# Altium footprint library my Library.PcbLib: 1247 footprints (part 7 of 78)
Each footprint in its own frame and in the unit in brackets; x right, y up, seen from the top. Pads: shape width x height; smd on the part's side, far side on the other; paste and mask are expansions set on the pad; w line width, h text height; cw(c..) or ccw(c..) is an arc to the next point about the centre after c.
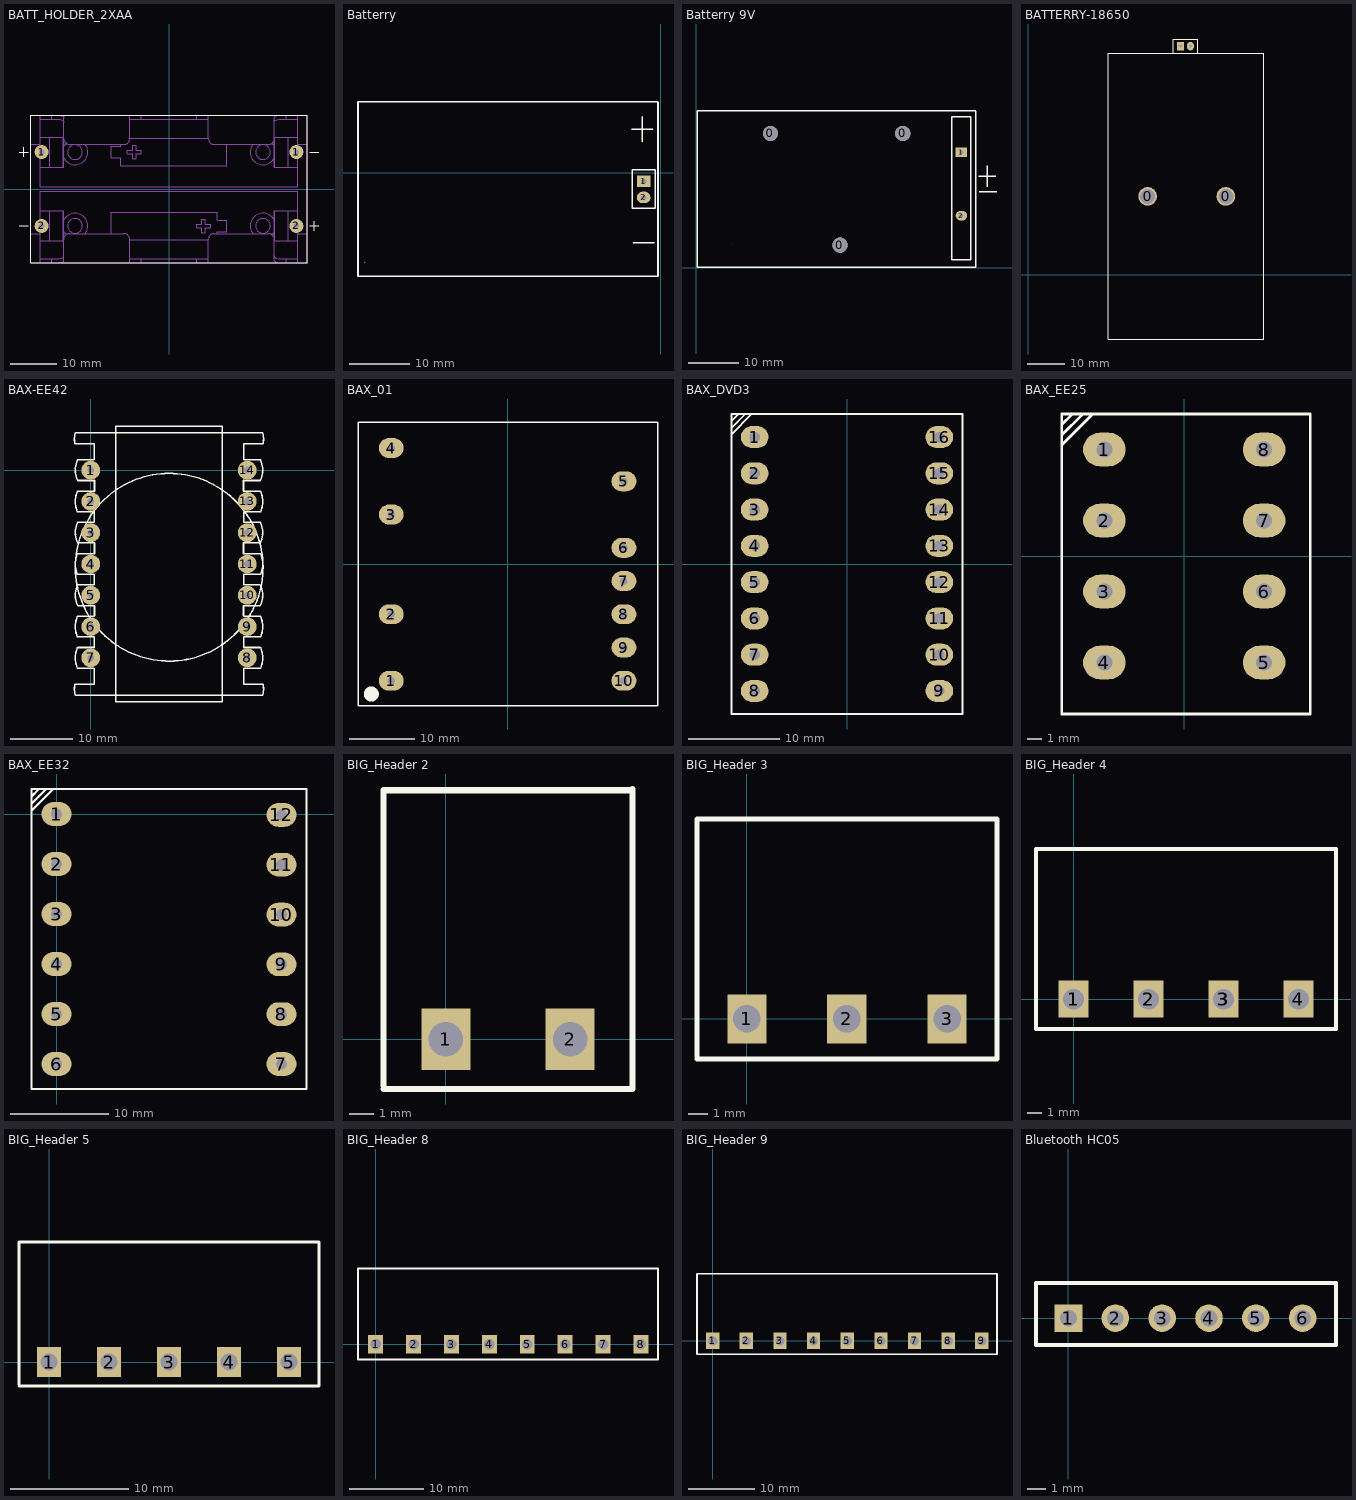
[diagram p6: the footprints below, top view; thin cyan lines are the x and y axes]

## BATT_HOLDER_2XAA [mil] "2-cell AA battery holder"
height 660
pads (4):
  round 120 hole 48: 1(-1086.61,314.96) 1(1086.61,314.96) 2(-1086.61,-314.96) 2(1086.61,-314.96)
Top Overlay:
  lines w5: -1279.53,-314.96 -1200.79,-314.96 ; -1279.53,314.96 -1200.79,314.96 ; -1240.16,275.59 -1240.16,354.33 ; 1200.79,-314.96 1279.53,-314.96 ; 1200.79,314.96 1279.53,314.96 ; 1240.16,-354.33 1240.16,-275.59
  lines w7.87: -1181.1,-629.92 1181.1,-629.92 1181.1,629.92 -1181.1,629.92 -1181.1,-629.92
Mechanical 13:
  drawing of 198 lines, arcs and shapes, not listed
3D body "2xAA Battery Holder.STEP": height 657.48, standoff -118.11, extent -1181.1,-629.91 1181.1,629.93
3D body "User Library-Battery-AAA.STEP": height 595.47, standoff 191.93, extent -958.03,55 788.03,458.55
3D body "User Library-Battery-AAA.STEP": height 595.47, standoff 191.93, extent -918.03,-470 828.03,-66.45

## Batterry [mil]
pads (2):
  rect 90x75 hole 34: 1(-112.5,-54.6)
  oval 90x75 hole 34: 2(-112.5,-159.6)
Top Overlay:
  lines w10: -188.8,284 -54.5,284 ; -182.1,-455.9 -43.1,-455.9 ; -120.9,202.1 -120.9,365.8 ; -20,463.4 -1974.6,463.4 -1974.6,-672.4 -19.27,-672.4 -19.27,459.86 ; -187.5,-229.6 -187.5,20.4 -37.5,20.4 -37.5,-229.6 -187.5,-229.6
Mechanical 1:
  lines w10: -1929.25,-583.45 -1929.2,-583.41
3D body "User Library-Aluminum 9 Volt Battery Holder.STEP": height 718.5, standoff 0, extent -1960.3,-666.19 -27.8,458.8

## Batterry 9V [mil]
pads (5):
  round 120 hole 120: 0(581.4,1052.4) 0(1126.9,175.9) 0(1620.4,1052.5)
  rect 90x75 hole 34: 1(2080.5,905.75)
  oval 90x75 hole 34: 2(2080.5,407.05)
Top Overlay:
  lines w10: 2193,1230.1 4.6,1230.1 4.6,3.1 2193.73,3.1 2193.73,1226.56 ; 2216.7,717.5 2351,717.5 ; 2221,595 2360,595 ; 2284.6,635.6 2284.6,799.3 ; 2005.5,60 2155.5,60 2155.5,1185 2005.5,1185 2005.5,60
Mechanical 1:
  lines w10: 283.75,183.25 283.8,183.29
3D body "User Library-PP3 9V battery holder.STEP": height 855.91, standoff 44.88, extent 27.27,19.55 2172.93,1210.5
3D body "User Library-9V Duracell Battery-1.STEP": height 894.49, standoff 205.51, extent 140.78,88.65 2050.23,1131.96

## BATTERRY-18650 [mil]
pads (4):
  round 196.85 hole 157.48: 0(1260,825) 0(2085,825)
  rect 75x90 hole 34: 1(1606.1,2410.5)
  oval 75x90 hole 34: 2(1711.1,2410.5)
Top Overlay:
  lines w10: 845,-680 845,2335 2485,2335 2485,-680 845,-680 ; 1531.1,2335.5 1531.1,2485.5 1781.1,2485.5 1781.1,2335.5 1531.1,2335.5
3D body "User Library-18650 battery.STEP": height 959.53, standoff 242.99, extent 905,-497.48 1621.53,2067.48
3D body "User Library-18650 holder x2.STEP": height 826.77, standoff 0, extent 860.82,-671.06 2475,2321.06
3D body "User Library-18650 battery - Copy.STEP": height 959.53, standoff 242.99, extent 1698.47,-492.48 2415,2072.48

## BAX-EE42 [mm]
pads (14):
  round 3 hole 1.1: 1(0,0) 2(0,-5) 3(0,-10) 4(0,-15) 5(0,-20) 6(0,-25) 7(0,-30) 8(25,-30) 9(25,-25) 10(25,-20) 11(25,-15) 12(25,-10) 13(25,-5) 14(25,0)
Top Overlay:
  lines w0.254: -2.54,-34.199 ccw(c1.383,-34.971) -2.495,-35.943 ; -2.54,4.201 cw(c1.383,4.974) -2.495,5.945 ; -2.515,-34.188 0.559,-34.188 0.559,-31.648 -2.083,-31.648 ; -2.515,4.191 0.559,4.191 0.559,1.651 -2.083,1.651 ; -2.5,-36 27.5,-36 ; -2.5,6 27.5,6 ; -2.464,-14.986 ccw(c12.522,-15.519) -2.458,-14.838 ; -2.147,-28.374 ccw(c1.506,-30.001) -2.136,-31.652 ; -2.147,-23.371 ccw(c1.506,-24.997) -2.136,-26.648 ; -2.147,-13.363 ccw(c1.506,-14.989) -2.136,-16.64 ; -2.147,-3.381 ccw(c1.506,-5.007) -2.136,-6.658 ; -2.121,-18.367 ccw(c1.531,-19.993) -2.11,-21.644 ; -2.121,-8.359 ccw(c1.531,-9.985) -2.11,-11.636 ; -2.121,1.623 ccw(c1.531,-0.003) -2.11,-1.654 ; -2.108,-28.346 0.533,-28.346 ; -2.108,-23.343 0.533,-23.343 ; -2.108,-13.335 0.533,-13.335 ; -2.108,-3.353 0.533,-3.353 ; -2.083,-26.645 0.559,-26.645 ; -2.083,-18.339 0.559,-18.339 ; -2.083,-16.637 0.559,-16.637 0.559,-18.288 ; -2.083,-8.331 0.559,-8.331 ; -2.083,-6.655 0.559,-6.655 0.559,-8.306 ; -2.057,-21.641 0.584,-21.641 0.584,-23.292 ; -2.057,-11.633 0.584,-11.633 ; -2.057,-1.651 0.584,-1.651 ; 0.559,-28.321 0.559,-26.67 ; 0.584,-13.335 0.584,-11.684 ; 0.584,-3.353 0.584,-1.702 ; 4.013,-37.008 4.013,7.01 20.98,7.01 20.98,-37.008 4.039,-37.008 ; 24.409,-23.292 24.409,-21.641 27.051,-21.641 ; 24.409,-13.335 24.409,-11.684 ; 24.409,-11.633 27.051,-11.633 ; 24.409,-3.353 24.409,-1.702 ; 24.409,-1.651 27.051,-1.651 ; 24.435,-28.321 24.435,-26.67 ; 24.435,-26.645 27.076,-26.645 ; 24.435,-18.339 27.076,-18.339 ; 24.435,-18.288 24.435,-16.637 27.076,-16.637 ; 24.435,-8.331 27.076,-8.331 ; 24.435,-8.306 24.435,-6.655 27.076,-6.655 ; 24.46,-28.346 27.102,-28.346 ; 24.46,-23.343 27.102,-23.343 ; 24.46,-13.335 27.102,-13.335 ; 24.46,-3.353 27.102,-3.353 ; 27.076,-31.648 24.435,-31.648 24.435,-34.188 27.508,-34.188 ; 27.076,1.651 24.435,1.651 24.435,4.191 27.508,4.191 ; 27.104,-21.644 ccw(c23.462,-19.993) 27.115,-18.367 ; 27.104,-11.636 ccw(c23.462,-9.985) 27.115,-8.359 ; 27.104,-1.654 ccw(c23.462,-0.003) 27.115,1.623 ; 27.129,-31.652 ccw(c23.488,-30.001) 27.14,-28.374 ; 27.129,-26.648 ccw(c23.488,-24.997) 27.14,-23.371 ; 27.129,-16.64 ccw(c23.488,-14.989) 27.14,-13.363 ; 27.129,-6.658 ccw(c23.488,-5.007) 27.14,-3.381 ; 27.489,-35.943 ccw(c23.61,-34.971) 27.533,-34.199 ; 27.489,5.945 cw(c23.61,4.974) 27.533,4.201

## BAX_01 [mil] "Bien ap xung cho nguon T9AT"
pads (10):
  oval 150x120 hole 45: 1(-700,-700) 2(-700,-300) 3(-700,300) 4(-700,700) 5(700,500) 6(700,100) 7(700,-100) 8(700,-300) 9(700,-500) 10(700,-700)
Top Overlay:
  circle w50: c-820,-780 r20
  lines w8: -900,-850 905,-850 905,855 -900,855 -900,-850

## BAX_DVD3 [mil] "Bien ap xung DVD3"
pads (16):
  oval 120x95 hole 45: 1(-400,550) 2(-400,392.86) 3(-400,235.71) 4(-400,78.57) 5(-400,-78.57) 6(-400,-235.71) 7(-400,-392.86) 8(-400,-550) 9(400,-550) 10(400,-392.86) 11(400,-235.71) 12(400,-78.57) 13(400,78.57) 14(400,235.71) 15(400,392.86) 16(400,550)
Top Overlay:
  lines w8: -500,563 -414,649 ; -500,589 -500,591 -442,649 ; -500,618 -500,620 -471,649 ; -500,-650 -500,650 490,650 500,650 500,-650 -500,-650

## BAX_EE25 [mil] "EE25"
pads (8):
  oval 120x95 hole 45: 1(-225,300) 2(-225,100) 3(-225,-100) 4(-225,-300) 5(225,-300) 6(225,-100) 7(225,100) 8(225,300)
Top Overlay:
  lines w8: -345,313 -259,399 ; -345,339 -345,341 -287,399 ; -345,368 -345,370 -316,399 ; -345,-445 355,-445 355,400 -345,400 -345,-445

## BAX_EE32 [mil] "EE32"
pads (12):
  oval 120x95 hole 45: 1(0,0) 2(0,-200) 3(0,-400) 4(0,-600) 5(0,-800) 6(0,-1000) 7(900,-1000) 8(900,-800.71) 9(900,-601.43) 10(900,-402.14) 11(900,-202.86) 12(900,-3.57)
Top Overlay:
  lines w8: -100,13 -14,99 ; -100,39 -100,41 -42,99 ; -100,68 -100,70 -71,99 ; -100,-1100 1000,-1100 1000,100 -100,100 -100,-1100

## BIG_Header 2 [mm]
pads (2):
  rect 2x2.5 hole 1.4: 1(0,0) 2(5.08,0)
Top Overlay:
  lines w0.254: -2.54,-2.032 7.62,-2.032 7.62,10.211 ; -2.54,-1.905 -2.54,10.173 ; -2.54,10.16 7.62,10.16
3D body "User Library-BigHeader 5EHDR_1P.step": height 3.15, standoff -9.32, extent -2.5,-1.75 2.5,10.25
3D body "User Library-BigHeader 5EHDR_1P.step": height 3.15, standoff -9.32, extent 2.58,-1.75 7.58,10.25

## BIG_Header 3 [mm]
pads (3):
  rect 2x2.5 hole 1.4: 1(0,0) 2(5.08,0) 3(10.173,0)
Top Overlay:
  lines w0.254: -2.54,-2.032 12.713,-2.032 12.713,10.16 -2.54,10.16 -2.54,-1.905
3D body "User Library-BigHeader 5EHDR_1P.step": height 3.15, standoff -9.32, extent 7.673,-1.75 12.673,10.25
3D body "User Library-BigHeader 5EHDR_1P.step": height 3.15, standoff -9.32, extent 2.593,-1.75 7.593,10.25
3D body "User Library-BigHeader 5EHDR_1P.step": height 3.15, standoff -9.32, extent -2.5,-1.75 2.5,10.25

## BIG_Header 4 [mm]
pads (7):
  rect 2x2.5 hole 1.4: 1(0,0) 1(0,0) 2(5.08,0) 2(5.08,0) 3(10.16,0) 3(10.173,0) 4(15.24,0)
Top Overlay:
  lines w0.254: 12.713,-2.032 -2.54,-2.032 7.62,-2.032 17.78,-2.032 17.78,10.173 -2.527,10.173 -2.54,10.173 -2.54,-1.905 -2.54,10.16 ; 12.713,10.16 -2.54,10.16 ; 17.78,10.16 -2.54,10.16
3D body "User Library-BigHeader 5EHDR_1P.step": height 3.15, standoff -9.32, extent 12.74,-1.75 17.74,10.25
3D body "User Library-BigHeader 5EHDR_1P.step": height 3.15, standoff -9.32, extent 7.66,-1.75 12.66,10.25
3D body "User Library-BigHeader 5EHDR_1P.step": height 3.15, standoff -9.32, extent 2.58,-1.75 7.58,10.25
3D body "User Library-BigHeader 5EHDR_1P.step": height 3.15, standoff -9.32, extent -2.5,-1.75 2.5,10.25

## BIG_Header 5 [mm]
pads (5):
  rect 2x2.5 hole 1.4: 1(0,0) 2(5.08,0) 3(10.16,0) 4(15.24,0) 5(20.32,0)
Top Overlay:
  lines w0.254: -2.54,-2.032 7.62,-2.032 22.86,-2.032 22.86,10.16 ; -2.54,-1.905 -2.54,10.16 ; -2.54,10.16 6.248,10.16 22.86,10.16 ; -2.54,10.16 22.86,10.16
3D body "User Library-BigHeader 5EHDR_1P.step": height 3.15, standoff -9.32, extent 17.82,-1.75 22.82,10.25
3D body "User Library-BigHeader 5EHDR_1P.step": height 3.15, standoff -9.32, extent 12.74,-1.75 17.74,10.25
3D body "User Library-BigHeader 5EHDR_1P.step": height 3.15, standoff -9.32, extent 7.66,-1.75 12.66,10.25
3D body "User Library-BigHeader 5EHDR_1P.step": height 3.15, standoff -9.32, extent 2.58,-1.75 7.58,10.25
3D body "User Library-BigHeader 5EHDR_1P.step": height 3.15, standoff -9.32, extent -2.5,-1.75 2.5,10.25

## BIG_Header 8 [mm]
pads (8):
  rect 2x2.5 hole 1.4: 1(0,0) 2(5.08,0) 3(10.16,0) 4(15.24,0) 5(20.32,0) 6(25.4,0) 7(30.48,0) 8(35.56,0)
Top Overlay:
  lines w0.254: 13.843,10.16 37.846,10.16 37.846,-2.032 27.94,-2.032 17.78,-2.032 7.62,-2.032 -2.362,-2.032 -2.362,10.16 17.78,10.16
3D body "User Library-BigHeader 5EHDR_1P.step": height 3.15, standoff -9.32, extent -2.5,-1.75 2.5,10.25
3D body "User Library-BigHeader 5EHDR_1P.step": height 3.15, standoff -9.32, extent 2.58,-1.75 7.58,10.25
3D body "User Library-BigHeader 5EHDR_1P.step": height 3.15, standoff -9.32, extent 7.66,-1.75 12.66,10.25
3D body "User Library-BigHeader 5EHDR_1P.step": height 3.15, standoff -9.32, extent 12.74,-1.75 17.74,10.25
3D body "User Library-BigHeader 5EHDR_1P.step": height 3.15, standoff -9.32, extent 17.82,-1.75 22.82,10.25
3D body "User Library-BigHeader 5EHDR_1P.step": height 3.15, standoff -9.32, extent 22.9,-1.75 27.9,10.25
3D body "User Library-BigHeader 5EHDR_1P.step": height 3.15, standoff -9.32, extent 27.98,-1.75 32.98,10.25
3D body "User Library-BigHeader 5EHDR_1P.step": height 3.15, standoff -9.32, extent 33.06,-1.75 38.06,10.25

## BIG_Header 9 [mm]
pads (9):
  rect 2x2.5 hole 1.4: 1(0,0) 2(5.08,0) 3(10.16,0) 4(15.24,0) 5(20.32,0) 6(25.4,0) 7(30.48,0) 8(35.56,0) 9(40.64,0)
Top Overlay:
  lines w0.254: 13.843,10.16 42.926,10.16 42.926,-2.032 27.94,-2.032 17.78,-2.032 7.62,-2.032 -2.362,-2.032 -2.362,10.16 17.78,10.16
3D body "User Library-BigHeader 5EHDR_1P.step": height 3.15, standoff -9.32, extent -2.5,-1.75 2.5,10.25
3D body "User Library-BigHeader 5EHDR_1P.step": height 3.15, standoff -9.32, extent 2.58,-1.75 7.58,10.25
3D body "User Library-BigHeader 5EHDR_1P.step": height 3.15, standoff -9.32, extent 7.66,-1.75 12.66,10.25
3D body "User Library-BigHeader 5EHDR_1P.step": height 3.15, standoff -9.32, extent 12.74,-1.75 17.74,10.25
3D body "User Library-BigHeader 5EHDR_1P.step": height 3.15, standoff -9.32, extent 17.82,-1.75 22.82,10.25
3D body "User Library-BigHeader 5EHDR_1P.step": height 3.15, standoff -9.32, extent 22.9,-1.75 27.9,10.25
3D body "User Library-BigHeader 5EHDR_1P.step": height 3.15, standoff -9.32, extent 27.98,-1.75 32.98,10.25
3D body "User Library-BigHeader 5EHDR_1P.step": height 3.15, standoff -9.32, extent 33.06,-1.75 38.06,10.25
3D body "User Library-BigHeader 5EHDR_1P.step": height 3.15, standoff -9.32, extent 38.14,-1.75 43.14,10.25

## Bluetooth HC05 [mm] "Connector; Header; 6 Position"
height 1.14
pads (6):
  rect 1.5x1.5 hole 0.9: 1(0,0)
  round 1.5 hole 0.9: 2(2.54,0) 3(5.08,0) 4(7.62,0) 5(10.16,0) 6(12.7,0)
Top Overlay:
  lines w0.2: -1.763,-1.455 14.511,-1.455 14.511,1.905 -1.763,1.905 -1.763,-1.455
3D body "User Library-blue.STEP": height 38, standoff -1.42, extent -1.649,-3.556 14.351,1.239
3D body "female_header_a-bl254-eg-g06d.stp": height 7.92, standoff -3.78, extent -1.395,-1.237 14.095,1.263